# Altium footprint library CustomCase.PcbLib: 281 footprints (part 2 of 18)
Each footprint in its own frame and in the unit in brackets; x right, y up, seen from the top. Pads: shape width x height; smd on the part's side, far side on the other; paste and mask are expansions set on the pad; w line width, h text height; cw(c..) or ccw(c..) is an arc to the next point about the centre after c.
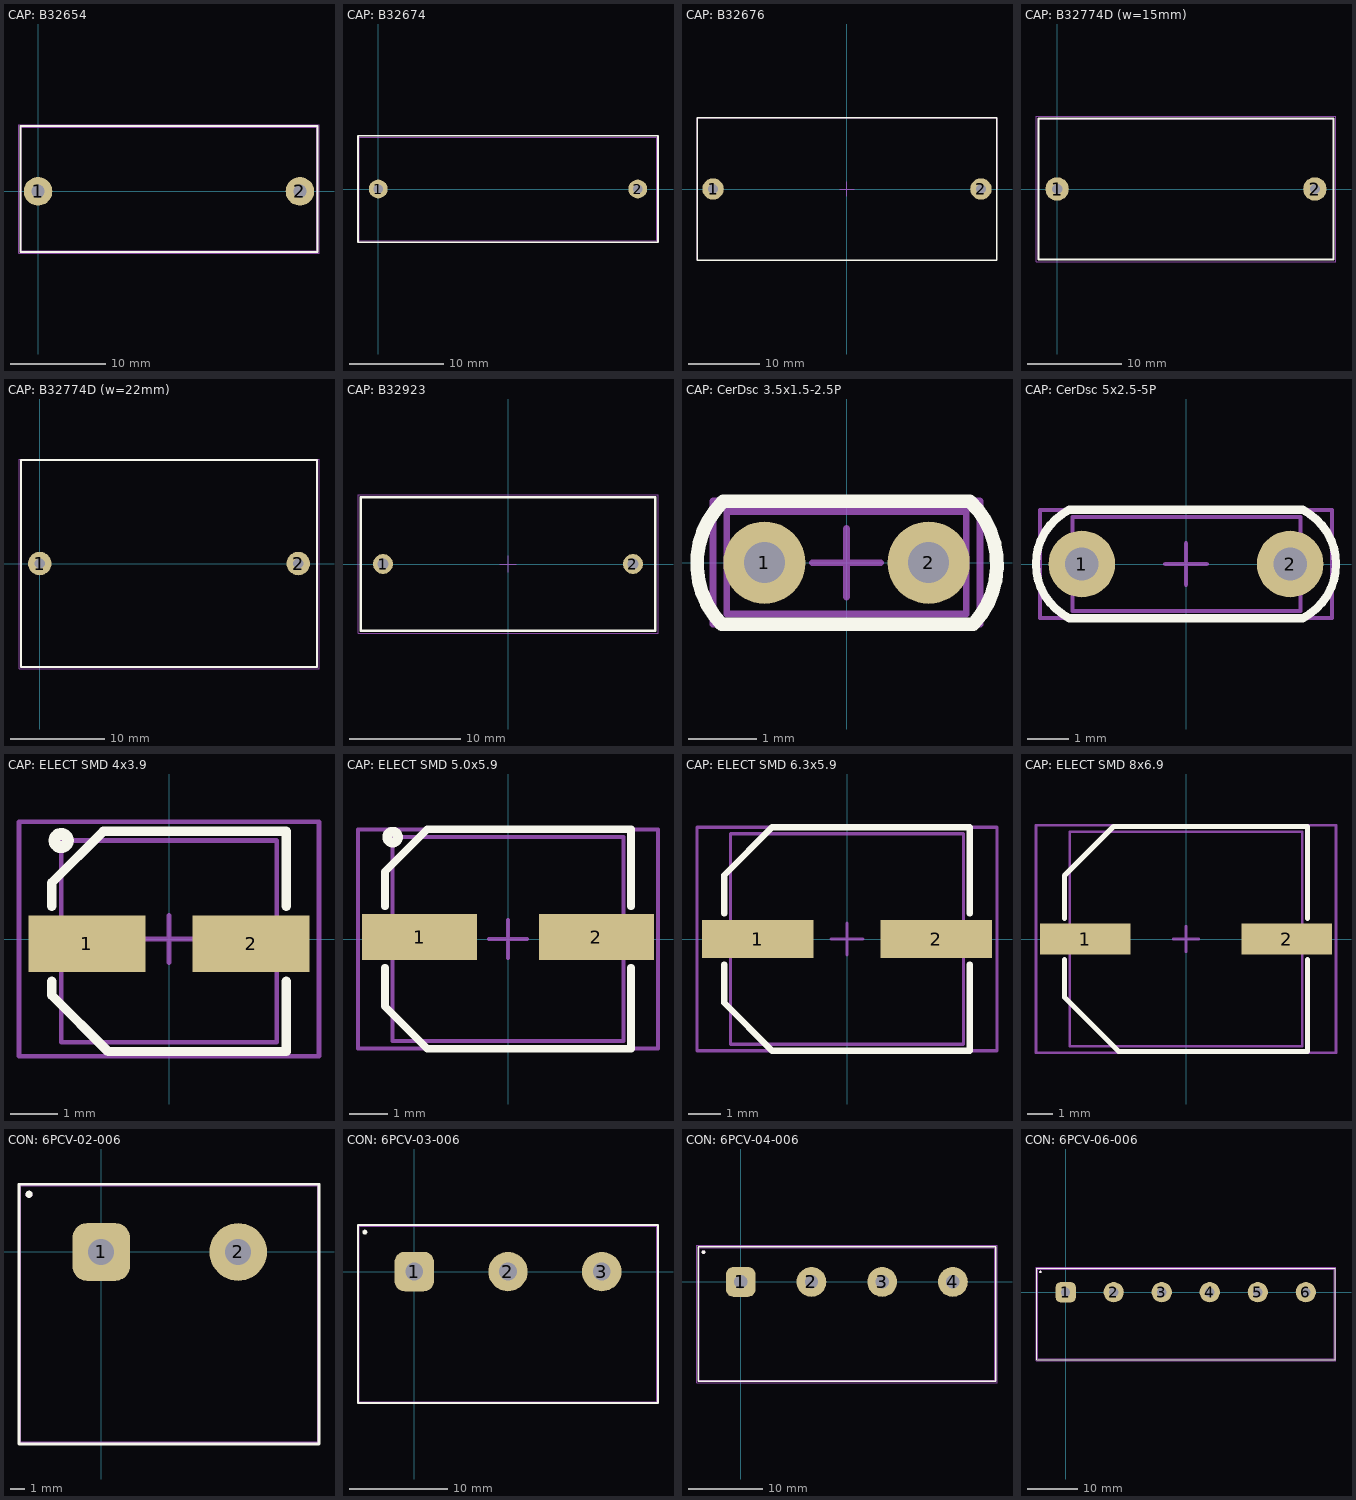
[diagram p1: the footprints below, top view; thin cyan lines are the x and y axes]

## CAP: B32654 [mm]
pads (2):
  round 3 hole 1.4: 1(0,0) 2(27.5,0)
Top Overlay:
  lines w0.2: -1.85,-6.35 -1.85,6.85 29.35,6.85 29.35,-6.35 -1.85,-6.35
Top Assy:
  lines w0.1: -1.75,-6.25 -1.75,6.75 29.25,6.75 29.25,-6.25 -1.75,-6.25
Border:
  lines w0.1: -2,-6.5 29.5,-6.5 29.5,7 -2,7 -2,-6.5
3D body "User Library-Vishay_1uF-400V_MKT_373_STD_27_5pitch.STEP": height 23, standoff -3, extent -1.75,-6.25 29.25,6.75

## CAP: B32674 [mm]
pads (2):
  round 2 hole 1: 1(0,0) 2(27.5,0)
Top Overlay:
  lines w0.2: -2.15,-5.65 -2.15,5.65 29.65,5.65 29.65,-5.65 -2.15,-5.65
Top Assy:
  lines w0.1: -2,-5.5 29.5,-5.5 29.5,5.5 -2,5.5 -2,-5.5
Border:
  lines w0.1: -2,-5.5 29.5,-5.5 29.5,5.5 -2,5.5 -2,-5.5
3D body "B32674.STEP": height 19, standoff -3, extent -2,-5.5 29.5,5.5

## CAP: B32676 [mm]
pads (2):
  round 3 hole 1.4: 1(-18.75,0) 2(18.75,0)
Top Overlay:
  lines w0.2: -21,-10 21,-10 21,10 -21,10 -21,-10
Top Assy:
  lines w0.1: -21,-10 -21,10 21,10 21,-10 -21,-10
Border:
  lines w0.1: -1,0 1,0 ; 0,-1 0,1 ; -21,-10 -21,10 21,10 21,-10 -21,-10
3D body "B32676.STEP": height 39.55, standoff -3, extent -21,-10 21,10

## CAP: B32774D (w=15mm) [mm]
pads (2):
  round 2.5 hole 1.1: 1(0,0) 2(27.5,0)
Top Overlay:
  lines w0.2: -2,-7.5 29.5,-7.5 29.5,7.5 -2,7.5 -2,-7.5
Top Assy:
  lines w0.1: -2,-7.5 29.5,-7.5 29.5,7.5 -2,7.5 -2,-7.5
Border:
  lines w0.1: -2.25,-7.75 29.75,-7.75 29.75,7.75 -2.25,7.75 -2.25,-7.75
3D body "2.STEP": height 24.55, standoff -2.95, extent -2,-7.5 29.5,7.5

## CAP: B32774D (w=22mm) [mm]
pads (2):
  round 2.5 hole 1.1: 1(0,0) 2(27.5,0)
Top Overlay:
  lines w0.2: -2,-11 -2,11 29.5,11 29.5,-11 -2,-11
Top Assy:
  lines w0.1: -2,-11 29.5,-11 29.5,11 -2,11 -2,-11
Border:
  lines w0.1: -2.2,-11.2 -2.2,11.1 29.7,11.1 29.7,-11.2 -2.2,-11.2
3D body "B32774D (w=22mm).STEP": height 36.5, standoff -3, extent -2,-11 29.5,11

## CAP: B32923 [mm]
pads (2):
  round 1.8 hole 1: 1(-11.25,0) 2(11.25,0)
Top Overlay:
  lines w0.2: -13.25,-6 13.25,-6 13.25,6 -13.25,6 -13.25,-6
Top Assy:
  lines w0.1: -13.25,-6 -13.25,6 13.25,6 13.25,-6 -13.25,-6
Border:
  lines w0.1: -0.75,0 0.75,0 ; 0,-0.75 0,0.75 ; -13.5,-6.25 13.5,-6.25 13.5,6.25 -13.5,6.25 -13.5,-6.25
3D body "B32923.STEP": height 22, standoff -3, extent -13.25,-6 13.25,6

## CAP: CerDsc 3.5x1.5-2.5P [mm]
pads (2):
  round 1.2 hole 0.6: 1(-1.2,0) 2(1.2,0)
Top Overlay:
  lines w0.2: -1.825,-0.9 cw(c-0.912,-0.013) -1.8,0.9 1.8,0.9 cw(c0.925,-0.025) 1.85,-0.9 -1.8,-0.9
Top Assy:
  lines w0.1: -1.75,-0.75 -1.75,0.75 1.75,0.75 1.75,-0.75 -1.75,-0.75
Border:
  lines w0.1: -0.5,0 0.5,0 ; 0,-0.5 0,0.5 ; -1.95,-0.9 -1.95,0.9 1.95,0.9 1.95,-0.9 -1.95,-0.9
3D body "User Library-Cer-Cap2 (3_5x1_5).STEP": height 4.5, standoff -2, extent -1.874,-1.124 1.874,1.126

## CAP: CerDsc 5x2.5-5P [mm]
pads (2):
  round 1.6 hole 0.8: 1(-2.5,0) 2(2.5,0)
Top Overlay:
  lines w0.2: -2.8,-1.3 cw(c-2.144,0) -2.8,1.3 2.8,1.3 cw(c2.144,0) 2.8,-1.3 -2.8,-1.3
Top Assy:
  lines w0.1: -2.725,-1.125 -2.725,-1.1 -2.725,1.125 2.75,1.125 2.75,-1.125 -2.725,-1.125
Border:
  lines w0.1: -0.5,0 0.5,0 ; 0,-0.5 0,0.5 ; -3.5,-1.3 -3.5,1.3 3.5,1.3 3.5,-1.3 -3.5,-1.3
3D body "User Library-Cer-Cap2_5 (5x1_5).STEP": height 5, standoff -3, extent -2.924,-1.72 2.924,1.721

## CAP: ELECT SMD 4x3.9 [mm]
pads (2):
  rect 2.5x1.2 smd: 1(-1.75,-0.1) 2(1.75,-0.1)
Top Overlay:
  circle w0.254: c-2.3,2.1 r0.141
  lines w0.2: -2.5,-0.9 -2.5,-1.2 -1.3,-2.4 2.5,-2.4 2.5,-0.9 ; -2.5,0.7 -2.5,1.2 -1.4,2.3 2.5,2.3 2.5,0.7
Top Assy:
  lines w0.1: -2.3,-2.2 -2.3,2.1 2.3,2.1 2.3,-2.2 -2.3,-2.2
Border:
  lines w0.1: -0.5,0 0.5,0 ; 0,-0.5 0,0.5 ; -3.2,-2.5 3.2,-2.5 3.2,2.5 -3.2,2.5 -3.2,-2.5
3D body "User Library-CAP SMD 4x3_9.STEP": height 3.91, standoff 0, extent -2.3,-2.2 2.3,2.1

## CAP: ELECT SMD 5.0x5.9 [mm]
pads (2):
  rect 3x1.2 smd: 1(-2.3,0.05) 2(2.3,0.05)
Top Overlay:
  circle w0.254: c-3,2.65 r0.141
  lines w0.2: -3.2,-0.75 -3.2,-1.75 -2.1,-2.85 3.2,-2.85 3.2,-0.75 ; -3.2,0.85 -3.2,1.75 -2.1,2.85 3.2,2.85 3.2,0.85
Top Assy:
  lines w0.1: -3,-2.65 3,-2.65 3,2.65 -3,2.65 -3,-2.65
Border:
  lines w0.1: -0.5,0 0.5,0 ; 0,-0.5 0,0.5 ; -3.9,-2.85 -3.9,2.85 3.9,2.85 3.9,-2.85 -3.9,-2.85
3D body "User Library-CAP SMD 5_0x5_9.STEP": height 5.9, standoff 0, extent -3,-2.65 3,2.65

## CAP: ELECT SMD 6.3x5.9 [mm]
pads (2):
  rect 3.5x1.2 smd: 1(-2.8,0) 2(2.8,0)
Top Overlay:
  lines w0.2: -3.85,-0.8 -3.85,-2 -2.35,-3.5 3.85,-3.5 3.85,-0.8 ; -3.85,0.8 -3.85,2 -2.35,3.5 3.85,3.5 3.85,0.8
Top Assy:
  lines w0.1: -3.65,-3.3 3.65,-3.3 3.65,3.3 -3.65,3.3 -3.65,-3.3
Border:
  lines w0.1: -0.5,0 0.5,0 ; 0,-0.5 0,0.5 ; -4.7,-3.5 4.7,-3.5 4.7,3.5 -4.7,3.5 -4.7,-3.5
3D body "User Library-CAP SMD 6_3x5_9.STEP": height 5.9, standoff 0, extent -3.65,-3.3 3.65,3.3

## CAP: ELECT SMD 8x6.9 [mm]
pads (2):
  rect 3.5x1.2 smd: 1(-3.9,0) 2(3.9,0)
Top Overlay:
  lines w0.2: -4.7,-0.8 -4.7,-2.25 -2.6,-4.35 4.7,-4.35 4.7,-4.25 4.7,-0.8 ; -4.7,0.8 -4.7,2.45 -2.8,4.35 4.7,4.35 4.7,0.8
Top Assy:
  lines w0.1: -4.5,-4.15 4.5,-4.15 4.5,4.15 -4.5,4.15 -4.5,-4.15
Border:
  lines w0.1: -0.5,0 0.5,0 ; 0,-0.5 0,0.5 ; -5.8,-4.4 5.8,-4.4 5.8,4.4 -5.8,4.4 -5.8,-4.4
3D body "User Library-CAP SMD 8_0x6_9.STEP": height 6.9, standoff 0, extent -4.5,-4.15 4.5,4.15

## CON: 6PCV-02-006 [mm]
pads (4):
  rrect50% 4x4 hole 1.8: 1(0,0)
  round 4 hole 1.8: 2(9.5,0)
  round 0.5 on Mech1: ""(-5,4)
  round 0.5 on Top Overlay: ""(-5,4)
Top Overlay:
  lines w0.2: -5.7,-13.3 15.1,-13.3 15.1,4.7 -5.7,4.7 -5.7,-13.3
Top Assy:
  lines w0.1: -5.6,-13.2 15,-13.2 15,4.58 -5.6,4.58 -5.6,-13.2
  text "1" at -0.2,-3.6 h2
  text "2" at 9.2,-3.6 h2
Border:
  lines w0.1: -5.7,-13.3 -5.7,4.7 15.1,4.7 15.1,-13.3 -5.7,-13.3
3D body "02.STEP": height 15.96, standoff -4.99, extent -5.6,-13.2 15,4.58

## CON: 6PCV-03-006 [mm]
pads (4):
  rrect50% 4x4 hole 1.8: 1(0,0)
  round 4 hole 1.8: 2(9.5,0) 3(19,0)
  round 0.5 on Top Overlay: ""(-5,4)
Top Overlay:
  lines w0.2: -5.7,-13.3 24.7,-13.3 24.7,4.7 -5.7,4.7 -5.7,-13.3
Top Assy:
  lines w0.1: -5.562,-13.2 24.562,-13.2 24.562,4.58 -5.562,4.58 -5.562,-13.2
  text "3" at 18.8,-3.6 h2
  text "2" at 9.2,-3.6 h2
  text "1" at -0.2,-3.6 h2
Border:
  lines w0.1: -5.675,-13.3 24.675,-13.3 24.675,4.675 -5.675,4.675 -5.675,-13.3
3D body "03.STEP": height 15.96, standoff -4.99, extent -5.562,-13.2 24.562,4.58

## CON: 6PCV-04-006 [mm]
pads (6):
  rrect50% 4x4 hole 1.8: 1(0,0)
  round 4 hole 1.8: 2(9.5,0) 3(19,0) 4(28.5,0)
  round 0.5 on Mech1: ""(-5,4)
  round 0.5 on Top Overlay: ""(-5,4)
Top Overlay:
  lines w0.2: -5.7,-13.35 -5.7,4.725 34.25,4.725 34.25,-13.35 -5.7,-13.35
Top Assy:
  lines w0.1: -5.55,-13.2 -5.55,4.58 34.1,4.58 34.1,-13.2 -5.55,-13.2
  text "1" at -0.2,-3.6 h2
  text "2" at 9.2,-3.6 h2
  text "3" at 18.8,-3.6 h2
  text "4" at 28.2,-3.6 h2
Border:
  lines w0.1: -5.875,-13.525 -5.875,4.9 34.425,4.9 34.425,-13.525 -5.875,-13.525
3D body "6pcv-04-006.STEP": height 15.96, standoff -4.99, extent -5.525,-13.18 34.125,4.6

## CON: 6PCV-06-006 [mm]
pads (8):
  rrect50% 4x4 hole 1.8: 1(0,0)
  round 4 hole 1.8: 2(9.5,0) 3(19,0) 4(28.5,0) 5(38,0) 6(47.5,0)
  round 0.5 on Mech1: ""(-5,4)
  round 0.5 on Top Overlay: ""(-5,4)
Top Overlay:
  lines w0.2: -5.7,-13.35 -5.7,4.725 53.3,4.725 53.3,-13.35 -5.7,-13.35
Top Assy:
  lines w0.1: -5.55,-13.2 -5.55,4.58 53.15,4.58 53.15,-13.2 -5.55,-13.2
  text "1" at -0.2,-3.6 h2
  text "2" at 9.2,-3.6 h2
  text "3" at 18.8,-3.6 h2
  text "4" at 28.2,-3.6 h2
  text "5" at 37.7,-3.6 h2
  text "6" at 47.2,-3.5 h2
Border:
  lines w0.1: -5.875,-13.525 -5.875,4.9 53.475,4.9 53.475,-13.525 -5.875,-13.525
3D body "6pcv-06-006.STEP": height 15.96, standoff -4.99, extent -5.55,-13.2 53.15,4.58